# Altium schematic symbol library FPGA_Xilinx_Virtex6.SchLib: 28 symbols (part 11 of 21)
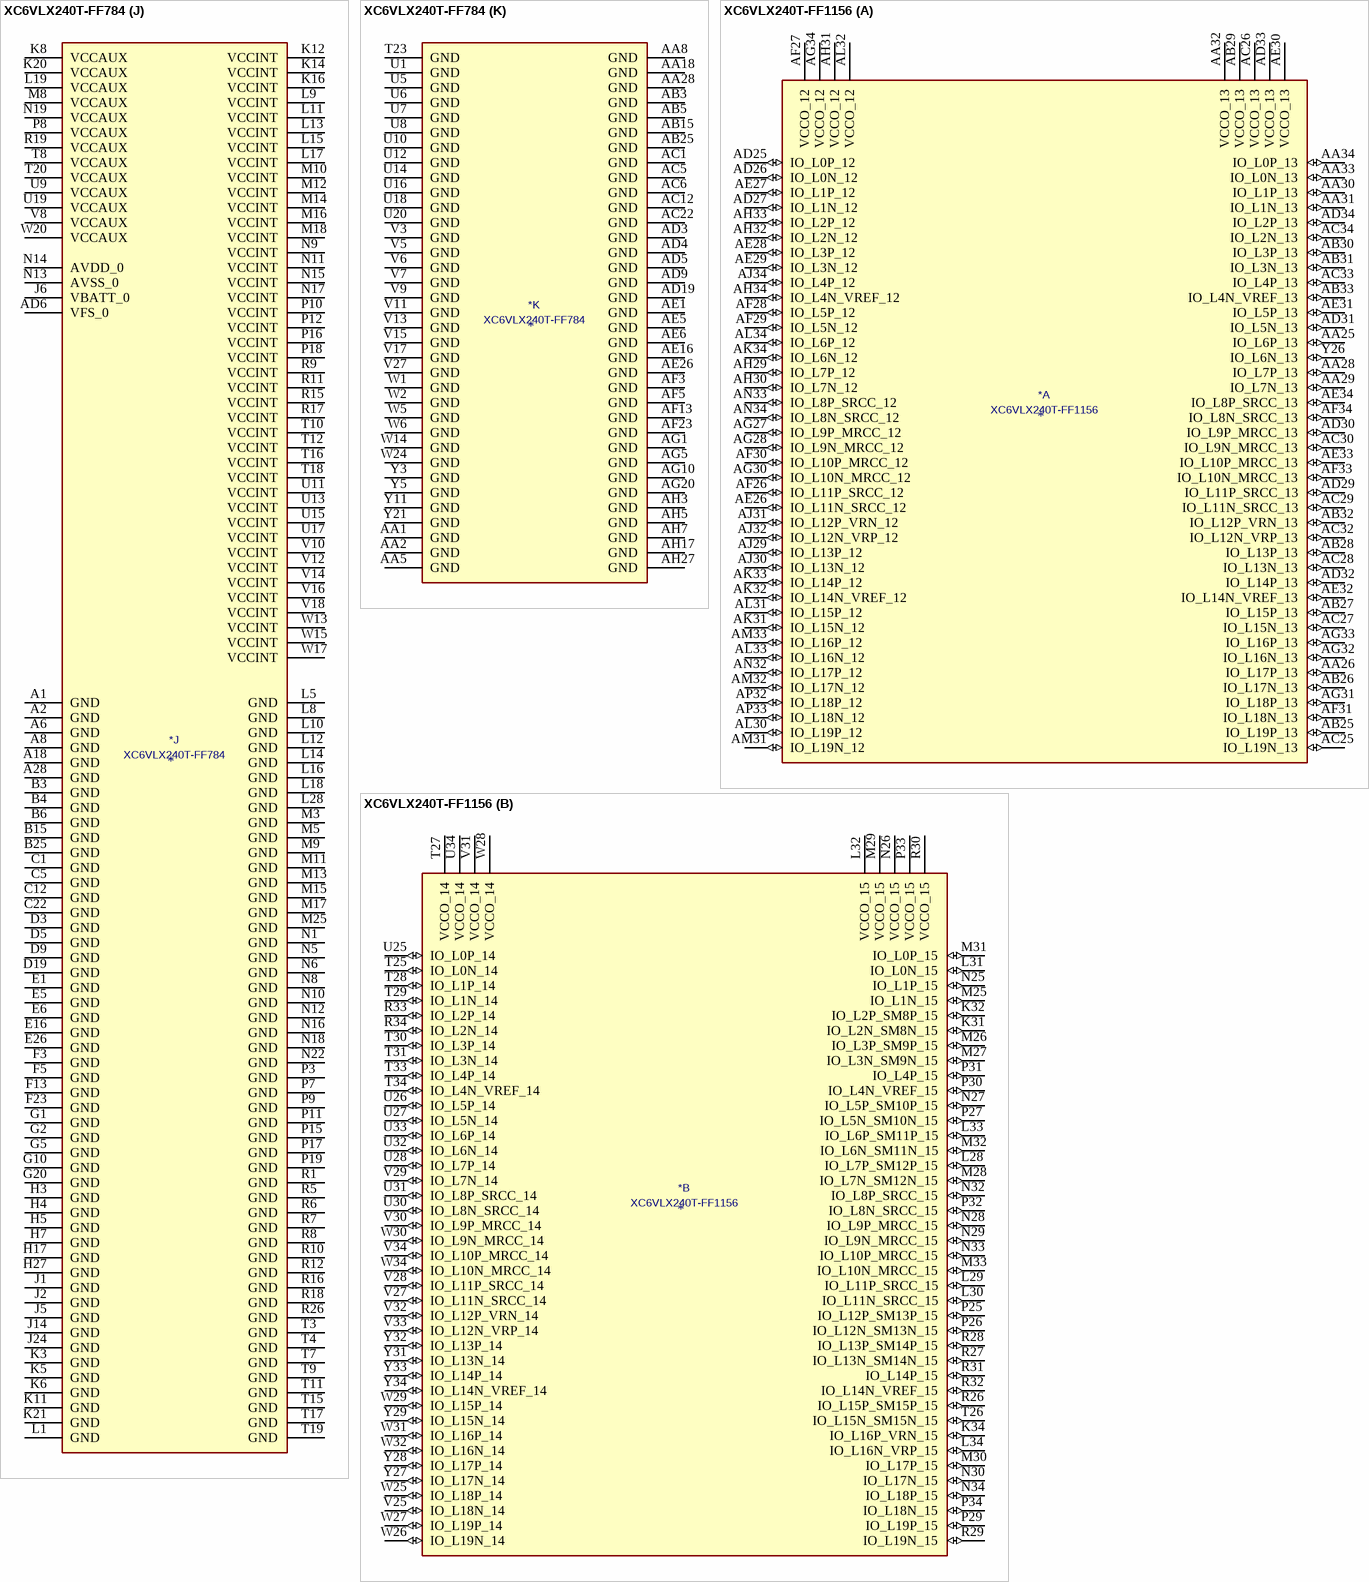
[diagram p111: symbols XC6VLX240T-FF784 to XC6VLX240T-FF1156]

## XC6VLX240T-FF784
designator *  value XC6VLX240T-FF784
ki_keywords: FPGA; ki_description: Virtex 6 LXT 240 XC6VLX240T-FF784
part A pins: H25 IO_L1P_15 (io), H26 IO_L1N_15 (io), J23 IO_L2N_SM8N_15 (io), J25 IO_L5N_SM10N_15 (io), J26 IO_L3P_SM9P_15 (io), J27 IO_L3N_SM9N_15 (io), J28 IO_L7P_SM12P_15 (io), K22 IO_L0P_15 (io), K23 IO_L0N_15 (io), K24 IO_L2P_SM8P_15 (io), K25 IO_L5P_SM10P_15 (io), K26 VCCO_15 (power), K27 IO_L9P_MRCC_15 (io), K28 IO_L7N_SM12N_15 (io), L20 IO_L4P_15 (io), L21 IO_L8P_SRCC_15 (io), L22 IO_L8N_SRCC_15 (io), L23 VCCO_15 (power), L24 IO_L14P_15 (io), L25 IO_L14N_VREF_15 (io), L26 IO_L9N_MRCC_15 (io), L27 IO_L12N_SM13N_15 (io), M19 IO_L4N_VREF_15 (io), M20 VCCO_15 (power), M21 IO_L10N_MRCC_15 (io), M22 IO_L10P_MRCC_15 (io), M23 IO_L6P_SM11P_15 (io), M24 IO_L6N_SM11N_15 (io), M26 IO_L11P_SRCC_15 (io), M27 IO_L12P_SM13P_15 (io), M28 IO_L15N_SM15N_15 (io), N20 IO_L18P_15 (io), N21 IO_L18N_15 (io), N23 IO_L19P_15 (io), N24 IO_L16P_VRN_15 (io), N25 IO_L16N_VRP_15 (io), N26 IO_L11N_SRCC_15 (io), N27 VCCO_15 (power), N28 IO_L15P_SM15P_15 (io), P20 IO_L14N_VREF_14 (io), P21 IO_L8P_SRCC_14 (io), P22 IO_L8N_SRCC_14 (io), P23 IO_L19N_15 (io), P24 VCCO_15 (power), P25 IO_L17N_15 (io), P26 IO_L17P_15 (io), P27 IO_L13N_SM14N_15 (io), P28 IO_L13P_SM14P_15 (io), R20 IO_L14P_14 (io), R21 VCCO_14 (power), R22 IO_L18P_14 (io), R23 IO_L18N_14 (io), R24 IO_L12P_VRN_14 (io), R25 IO_L12N_VRP_14 (io), R27 IO_L0P_14 (io), R28 IO_L0N_14 (io), T21 IO_L19P_14 (io), T22 IO_L19N_14 (io), T24 IO_L15P_14 (io), T25 IO_L15N_14 (io), T26 IO_L10N_MRCC_14 (io), T27 IO_L1P_14 (io), T28 VCCO_14 (power), U21 IO_L17N_14 (io), U22 IO_L17P_14 (io), U23 IO_L11N_SRCC_14 (io), U24 IO_L16N_14 (io), U25 VCCO_14 (power), U26 IO_L10P_MRCC_14 (io), U27 IO_L1N_14 (io), U28 IO_L2N_14 (io), V22 VCCO_14 (power), V23 IO_L11P_SRCC_14 (io), V24 IO_L16P_14 (io), V25 IO_L3N_14 (io), V26 IO_L4N_VREF_14 (io), V28 IO_L2P_14 (io), W22 IO_L13N_14 (io), W23 IO_L9N_MRCC_14 (io), W25 IO_L3P_14 (io), W26 IO_L4P_14 (io), W27 IO_L6P_14 (io), W28 IO_L5N_14 (io), Y22 IO_L13P_14 (io), Y23 IO_L9P_MRCC_14 (io), Y24 IO_L7N_14 (io), Y25 IO_L7P_14 (io), Y26 VCCO_14 (power), Y27 IO_L6N_14 (io), Y28 IO_L5P_14 (io)
part B pins: A26 IO_L7P_16 (io), A27 IO_L7N_16 (io), AA19 IO_L12P_VRN_23 (io), AA20 IO_L11N_SRCC_23 (io), AA21 IO_L5P_23 (io), AB18 IO_L16P_23 (io), AB19 IO_L15N_23 (io), AB20 VCCO_23 (power), AB21 IO_L5N_23 (io), AC18 IO_L16N_23 (io), AC19 IO_L15P_23 (io), AC20 IO_L9N_MRCC_23 (io), AC21 IO_L1N_23 (io), AD18 IO_L14P_23 (io), AD20 IO_L8P_SRCC_23 (io), AD21 IO_L9P_MRCC_23 (io), AD22 IO_L1P_23 (io), AE18 IO_L14N_VREF_23 (io), AE19 IO_L10N_MRCC_23 (io), AE20 IO_L8N_SRCC_23 (io), AE21 VCCO_23 (power), AE22 IO_L4N_VREF_23 (io), AF17 IO_L13N_23 (io), AF18 VCCO_23 (power), AF19 IO_L10P_MRCC_23 (io), AF20 IO_L7N_23 (io), AF21 IO_L3N_23 (io), AF22 IO_L4P_23 (io), AG17 IO_L13P_23 (io), AG18 IO_L18P_23 (io), AG19 IO_L19N_23 (io), AG21 IO_L7P_23 (io), AG22 IO_L3P_23 (io), AH18 IO_L18N_23 (io), AH19 IO_L19P_23 (io), AH20 IO_L17P_23 (io), AH21 IO_L17N_23 (io), AH22 VCCO_23 (power), B24 IO_L1P_16 (io), B26 IO_L3P_16 (io), B27 IO_L9P_MRCC_16 (io), B28 IO_L9N_MRCC_16 (io), C23 IO_L4N_VREF_16 (io), C24 IO_L1N_16 (io), C25 IO_L3N_16 (io), C26 IO_L18N_16 (io), C27 VCCO_16 (power), C28 IO_L11N_SRCC_16 (io), D22 IO_L4P_16 (io), D23 IO_L14N_VREF_16 (io), D24 VCCO_16 (power), D25 IO_L6N_16 (io), D26 IO_L18P_16 (io), D27 IO_L11P_SRCC_16 (io), D28 IO_L13P_16 (io), E22 IO_L5P_16 (io), E23 IO_L14P_16 (io), E24 IO_L6P_16 (io), E25 IO_L10P_MRCC_16 (io), E27 IO_L16N_16 (io), E28 IO_L13N_16 (io), F22 IO_L5N_16 (io), F24 IO_L10N_MRCC_16 (io), F25 IO_L15N_16 (io), F26 IO_L15P_16 (io), F27 IO_L16P_16 (io), F28 VCCO_16 (power), G22 IO_L0P_16 (io), G23 IO_L2N_16 (io), G24 IO_L12N_VRP_16 (io), G25 VCCO_16 (power), G26 IO_L17N_16 (io), G27 IO_L17P_16 (io), G28 IO_L19P_16 (io), H21 IO_L0N_16 (io), H22 VCCO_16 (power), H23 IO_L2P_16 (io), H24 IO_L12P_VRN_16 (io), H28 IO_L19N_16 (io), J21 IO_L8P_SRCC_16 (io), J22 IO_L8N_SRCC_16 (io), V19 IO_L2N_23 (io), V20 IO_L2P_23 (io), V21 IO_L0N_23 (io), W18 IO_L6N_23 (io), W19 VCCO_23 (power), W21 IO_L0P_23 (io), Y18 IO_L6P_23 (io), Y19 IO_L12N_VRP_23 (io), Y20 IO_L11P_SRCC_23 (io)
part C pins: A19 IO_L8N_SRCC_25 (io), A20 IO_L8P_SRCC_25 (io), A21 IO_L11P_SRCC_25 (io), A22 IO_L11N_SRCC_25 (io), A23 VCCO_25 (power), A24 IO_L15P_25 (io), A25 IO_L15N_25 (io), AA22 IO_L19N_24 (io), AA23 VCCO_24 (power), AA24 IO_L6P_D7_24 (io), AA25 IO_L6N_D6_24 (io), AA26 IO_L0P_GC_24 (io), AA27 IO_L0N_GC_24 (io), AB22 IO_L19P_24 (io), AB23 IO_L11P_SRCC_24 (io), AB24 IO_L16N_CSO_B_24 (io), AB26 IO_L8N_SRCC_24 (io), AB27 IO_L8P_SRCC_24 (io), AB28 IO_L2N_D14_24 (io), AC23 IO_L11N_SRCC_24 (io), AC24 IO_L16P_RS0_24 (io), AC25 IO_L7P_D5_24 (io), AC26 IO_L12P_D3_24 (io), AC27 VCCO_24 (power), AC28 IO_L2P_D15_24 (io), AD23 IO_L18N_24 (io), AD24 VCCO_24 (power), AD25 IO_L7N_D4_24 (io), AD26 IO_L12N_D2_FS2_24 (io), AD27 IO_L1N_GC_24 (io), AD28 IO_L1P_GC_24 (io), AE23 IO_L18P_24 (io), AE24 IO_L14P_FCS_B_24 (io), AE25 IO_L10P_MRCC_24 (io), AE27 IO_L5N_D8_24 (io), AE28 IO_L5P_D9_24 (io), AF24 IO_L14N_VREF_FOE_B_MOSI_24 (io), AF25 IO_L10N_MRCC_24 (io), AF26 IO_L9P_MRCC_24 (io), AF27 IO_L3N_D12_24 (io), AF28 VCCO_24 (power), AG23 IO_L17N_VRP_24 (io), AG24 IO_L15P_FWE_B_24 (io), AG25 VCCO_24 (power), AG26 IO_L9N_MRCC_24 (io), AG27 IO_L4P_D11_24 (io), AG28 IO_L3P_D13_24 (io), AH23 IO_L17P_VRN_24 (io), AH24 IO_L15N_RS1_24 (io), AH25 IO_L13N_D0_FS0_24 (io), AH26 IO_L13P_D1_FS1_24 (io), AH28 IO_L4N_VREF_D10_24 (io), B18 IO_L5P_25 (io), B19 IO_L5N_25 (io), B20 VCCO_25 (power), B21 IO_L13P_25 (io), B22 IO_L17P_25 (io), B23 IO_L17N_25 (io), C18 IO_L3P_25 (io), C19 IO_L12P_25 (io), C20 IO_L12N_25 (io), C21 IO_L13N_25 (io), D17 IO_L6P_25 (io), D18 IO_L3N_25 (io), D20 IO_L10P_MRCC_25 (io), D21 IO_L16N_VRP_25 (io), E17 IO_L6N_25 (io), E18 IO_L7P_25 (io), E19 IO_L10N_MRCC_25 (io), E20 IO_L16P_VRN_25 (io), E21 VCCO_25 (power), F17 IO_L1N_25 (io), F18 VCCO_25 (power), F19 IO_L7N_25 (io), F20 IO_L19P_GC_25 (io), F21 IO_L19N_GC_25 (io), G17 IO_L1P_25 (io), G18 IO_L4P_25 (io), G19 IO_L9N_MRCC_25 (io), G21 IO_L18N_GC_25 (io), H18 IO_L4N_VREF_25 (io), H19 IO_L9P_MRCC_25 (io), H20 IO_L18P_GC_25 (io), J17 IO_L2P_25 (io), J18 IO_L2N_25 (io), J19 VCCO_25 (power), J20 IO_L14N_VREF_25 (io), K17 IO_L0P_25 (io), K18 IO_L0N_25 (io), K19 IO_L14P_25 (io)
part D pins: A11 IO_L14P_26 (io), A12 IO_L14N_VREF_26 (io), A13 VCCO_26 (power), A14 IO_L9N_MRCC_26 (io), A15 IO_L13P_26 (io), A16 IO_L13N_26 (io), A17 IO_L17P_26 (io), AA12 IO_L8N_SRCC_34 (io), AA13 VCCO_34 (power), AA14 IO_L3N_A12_D28_34 (io), AA15 IO_L16P_A21_34 (io), AA16 IO_L17P_A19_34 (io), AA17 IO_L19N_VRP_34 (io), AB12 IO_L1P_GC_34 (io), AB13 IO_L3P_A13_D29_34 (io), AB14 IO_L5P_A09_D25_34 (io), AB16 IO_L14P_A25_34 (io), AB17 IO_L17N_A18_34 (io), AC13 IO_L1N_GC_34 (io), AC14 IO_L5N_A08_D24_34 (io), AC15 IO_L11N_SRCC_34 (io), AC16 IO_L14N_VREF_A24_34 (io), AC17 VCCO_34 (power), AD12 IO_L0N_GC_34 (io), AD13 IO_L6P_A07_D23_34 (io), AD14 VCCO_34 (power), AD15 IO_L11P_SRCC_34 (io), AD16 IO_L15P_A23_34 (io), AD17 IO_L12N_A02_D18_34 (io), AE13 IO_L0P_GC_34 (io), AE14 IO_L6N_A06_D22_34 (io), AE15 IO_L15N_A22_34 (io), AE17 IO_L12P_A03_D19_34 (io), AF14 IO_L4P_A11_D27_34 (io), AF15 IO_L10N_MRCC_34 (io), AF16 IO_L13P_A01_D17_34 (io), AG13 IO_L4N_VREF_A10_D26_34 (io), AG14 IO_L10P_MRCC_34 (io), AG15 VCCO_34 (power), AG16 IO_L13N_A00_D16_34 (io), AH13 IO_L7P_A05_D21_34 (io), AH14 IO_L7N_A04_D20_34 (io), AH15 IO_L9P_MRCC_34 (io), AH16 IO_L9N_MRCC_34 (io), B11 IO_L5P_26 (io), B12 IO_L18P_26 (io), B13 IO_L7N_26 (io), B14 IO_L9P_MRCC_26 (io), B16 IO_L15N_26 (io), B17 IO_L17N_26 (io), C11 IO_L5N_26 (io), C13 IO_L18N_26 (io), C14 IO_L7P_26 (io), C15 IO_L15P_26 (io), C16 IO_L16N_26 (io), C17 VCCO_26 (power), D11 IO_L0N_26 (io), D12 IO_L6N_26 (io), D13 IO_L6P_26 (io), D14 VCCO_26 (power), D15 IO_L12N_VRP_26 (io), D16 IO_L16P_26 (io), E11 VCCO_26 (power), E12 IO_L0P_26 (io), E13 IO_L1P_26 (io), E14 IO_L1N_26 (io), E15 IO_L12P_VRN_26 (io), F12 IO_L11N_SRCC_26 (io), F14 IO_L3N_26 (io), F15 IO_L10N_MRCC_26 (io), F16 IO_L10P_MRCC_26 (io), G12 IO_L11P_SRCC_26 (io), G13 IO_L19N_26 (io), G14 IO_L3P_26 (io), G15 VCCO_26 (power), G16 IO_L2N_26 (io), H14 IO_L19P_26 (io), H15 IO_L4N_VREF_26 (io), H16 IO_L2P_26 (io), J15 IO_L8P_SRCC_26 (io), J16 IO_L4P_26 (io), K15 IO_L8N_SRCC_26 (io), W12 IO_L2P_A15_D31_34 (io), W16 IO_L18P_A17_34 (io), Y12 IO_L2N_A14_D30_34 (io), Y13 IO_L8P_SRCC_34 (io), Y14 IO_L16N_A20_34 (io), Y15 IO_L18N_A16_34 (io), Y16 VCCO_34 (power), Y17 IO_L19P_VRN_34 (io)
part E pins: A7 IO_L3P_36 (io), A9 IO_L2N_36 (io), A10 IO_L2P_36 (io), AA7 IO_L2P_SM0P_35 (io), AA9 IO_L4P_35 (io), AA10 IO_L1N_35 (io), AA11 IO_L9N_MRCC_35 (io), AB7 IO_L2N_SM0N_35 (io), AB8 IO_L6N_SM3N_35 (io), AB9 IO_L4N_VREF_35 (io), AB10 VCCO_35 (power), AB11 IO_L9P_MRCC_35 (io), AC7 VCCO_35 (power), AC8 IO_L6P_SM3P_35 (io), AC9 IO_L3P_SM1P_35 (io), AC10 IO_L5P_SM2P_35 (io), AC11 IO_L7N_SM4N_35 (io), AD7 IO_L10P_MRCC_35 (io), AD8 IO_L3N_SM1N_35 (io), AD10 IO_L5N_SM2N_35 (io), AD11 IO_L7P_SM4P_35 (io), AE7 IO_L10N_MRCC_35 (io), AE8 IO_L12N_SM5N_35 (io), AE9 IO_L14P_35 (io), AE10 IO_L18N_GC_35 (io), AE11 VCCO_35 (power), AE12 IO_L15N_SM7N_35 (io), AF7 IO_L12P_SM5P_35 (io), AF8 VCCO_35 (power), AF9 IO_L14N_VREF_35 (io), AF10 IO_L18P_GC_35 (io), AF11 IO_L11P_SRCC_35 (io), AF12 IO_L15P_SM7P_35 (io), AG7 IO_L16P_VRN_35 (io), AG8 IO_L16N_VRP_35 (io), AG9 IO_L13P_SM6P_35 (io), AG11 IO_L11N_SRCC_35 (io), AG12 IO_L19N_GC_35 (io), AH8 IO_L13N_SM6N_35 (io), AH9 IO_L17P_35 (io), AH10 IO_L17N_35 (io), AH11 IO_L19P_GC_35 (io), AH12 VCCO_35 (power), B7 IO_L3N_36 (io), B8 IO_L1P_36 (io), B9 IO_L12P_VRN_36 (io), B10 VCCO_36 (power), C7 VCCO_36 (power), C8 IO_L1N_36 (io), C9 IO_L12N_VRP_36 (io), C10 IO_L8N_SRCC_36 (io), D7 IO_L14P_36 (io), D8 IO_L5P_36 (io), D10 IO_L8P_SRCC_36 (io), E7 IO_L14N_VREF_36 (io), E8 IO_L7P_36 (io), E9 IO_L5N_36 (io), E10 IO_L0N_36 (io), F7 IO_L9P_MRCC_36 (io), F8 VCCO_36 (power), F9 IO_L7N_36 (io), F10 IO_L6N_36 (io), F11 IO_L0P_36 (io), G7 IO_L9N_MRCC_36 (io), G8 IO_L13P_36 (io), G9 IO_L13N_36 (io), G11 IO_L6P_36 (io), H8 IO_L15P_36 (io), H9 IO_L15N_36 (io), H10 IO_L10N_MRCC_36 (io), H11 IO_L10P_MRCC_36 (io), H12 VCCO_36 (power), H13 IO_L4P_36 (io), J7 IO_L17P_36 (io), J8 IO_L17N_36 (io), J9 VCCO_36 (power), J10 IO_L16N_36 (io), J11 IO_L16P_36 (io), J12 IO_L11P_SRCC_36 (io), J13 IO_L4N_VREF_36 (io), K7 IO_L19P_36 (io), K9 IO_L18P_36 (io), K10 IO_L18N_36 (io), K13 IO_L11N_SRCC_36 (io), L7 IO_L19N_36 (io), W8 IO_L0P_35 (io), W9 VCCO_35 (power), W10 IO_L8N_SRCC_35 (io), W11 IO_L8P_SRCC_35 (io), Y9 IO_L0N_35 (io), Y10 IO_L1P_35 (io)
part F pins: AA3 MGTREFCLK0N_114 (io), AA4 MGTREFCLK0P_114 (io), AB1 MGTTXP2_114 (io), AB2 MGTTXN2_114 (io), AC3 MGTRXP3_114 (io), AC4 MGTRXN3_114 (io), AD1 MGTTXP1_114 (io), AD2 MGTTXN1_114 (io), AE3 MGTRXP2_114 (io), AE4 MGTRXN2_114 (io), AF1 MGTTXP0_114 (io), AF2 MGTTXN0_114 (io), AG3 MGTRXP1_114 (io), AG4 MGTRXN1_114 (io), AH1 MGTRXP0_114 (io), AH2 MGTRXN0_114 (io), L3 MGTRXP3_115 (io), L4 MGTRXN3_115 (io), M1 MGTTXP3_115 (io), M2 MGTTXN3_115 (io), N3 MGTRXP2_115 (io), N4 MGTRXN2_115 (io), P1 MGTTXP2_115 (io), P2 MGTTXN2_115 (io), P5 MGTREFCLK1N_115 (io), P6 MGTREFCLK1P_115 (io), R3 MGTRXP1_115 (io), R4 MGTRXN1_115 (io), T1 MGTTXP1_115 (io), T2 MGTTXN1_115 (io), T5 MGTREFCLK0N_115 (io), T6 MGTREFCLK0P_115 (io), U3 MGTRXP0_115 (io), U4 MGTRXN0_115 (io), V1 MGTTXP0_115 (io), V2 MGTTXN0_115 (io), W3 MGTREFCLK1N_114 (io), W4 MGTREFCLK1P_114 (io), Y1 MGTTXP3_114 (io), Y2 MGTTXN3_114 (io)
part G pins: A3 MGTRXP3_116 (io), A4 MGTRXN3_116 (io), B1 MGTRXP2_116 (io), B2 MGTRXN2_116 (io), C3 MGTRXP1_116 (io), C4 MGTRXN1_116 (io), D1 MGTTXP3_116 (io), D2 MGTTXN3_116 (io), E3 MGTRXP0_116 (io), E4 MGTRXN0_116 (io), F1 MGTTXP2_116 (io), F2 MGTTXN2_116 (io), G3 MGTREFCLK1N_116 (io), G4 MGTREFCLK1P_116 (io), H1 MGTTXP1_116 (io), H2 MGTTXN1_116 (io), J3 MGTREFCLK0N_116 (io), J4 MGTREFCLK0P_116 (io), K1 MGTTXP0_116 (io), K2 MGTTXN0_116 (io)
part H pins: A5 MGTAVTTRCAL_115 (power), AB4 MGTAVCC (power), AC2 MGTAVTT (power), AE2 MGTAVTT (power), AF4 MGTAVCC (power), AG2 MGTAVTT (power), AH4 MGTAVCC (power), B5 MGTRREF_115 (power), C2 MGTAVTT (power), D4 MGTAVCC (power), E2 MGTAVTT (power), F4 MGTAVCC (power), K4 MGTAVCC (power), L2 MGTAVTT (power), M4 MGTAVCC (power), N2 MGTAVTT (power), P4 MGTAVCC (power), R2 MGTAVTT (power), U2 MGTAVTT (power), V4 MGTAVCC (power), Y4 MGTAVCC (power)
part I pins: AA6 TDI_0 (io), AB6 TCK_0 (io), AF6 DOUT_BUSY_0 (io), AG6 CSI_B_0 (io), AH6 CCLK_0 (io), C6 M2_0 (io), D6 M1_0 (io), F6 M0_0 (io), G6 RDWR_B_0 (io), H6 DIN_0 (io), L6 DONE_0 (io), M6 INIT_B_0 (io), M7 PROGRAM_B_0 (io), N7 HSWAPEN_0 (io), P13 VREFN_0 (io), P14 VP_0 (io), R13 VN_0 (io), R14 VREFP_0 (io), T13 DXN_0 (io), T14 DXP_0 (io), W7 VCCO_0 (power), Y6 TMS_0 (io), Y7 TDO_0 (io), Y8 VCCO_0 (power)
part J pins: A1 GND (power), A2 GND (power), A6 GND (power), A8 GND (power), A18 GND (power), A28 GND (power), AD6 VFS_0 (power), B3 GND (power), B4 GND (power), B6 GND (power), B15 GND (power), B25 GND (power), C1 GND (power), C5 GND (power), C12 GND (power), C22 GND (power), D3 GND (power), D5 GND (power), D9 GND (power), D19 GND (power), E1 GND (power), E5 GND (power), E6 GND (power), E16 GND (power), E26 GND (power), F3 GND (power), F5 GND (power), F13 GND (power), F23 GND (power), G1 GND (power), G2 GND (power), G5 GND (power), G10 GND (power), G20 GND (power), H3 GND (power), H4 GND (power), H5 GND (power), H7 GND (power), H17 GND (power), H27 GND (power), J1 GND (power), J2 GND (power), J5 GND (power), J6 VBATT_0 (power), J14 GND (power), J24 GND (power), K3 GND (power), K5 GND (power), K6 GND (power), K8 VCCAUX (power), K11 GND (power), K12 VCCINT (power), K14 VCCINT (power), K16 VCCINT (power), K20 VCCAUX (power), K21 GND (power), L1 GND (power), L5 GND (power), L8 GND (power), L9 VCCINT (power), L10 GND (power), L11 VCCINT (power), L12 GND (power), L13 VCCINT (power), L14 GND (power), L15 VCCINT (power), L16 GND (power), L17 VCCINT (power), L18 GND (power), L19 VCCAUX (power), L28 GND (power), M3 GND (power), M5 GND (power), M8 VCCAUX (power), M9 GND (power), M10 VCCINT (power), M11 GND (power), M12 VCCINT (power), M13 GND (power), M14 VCCINT (power), M15 GND (power), M16 VCCINT (power), M17 GND (power), M18 VCCINT (power), M25 GND (power), N1 GND (power), N5 GND (power), N6 GND (power), N8 GND (power), N9 VCCINT (power), N10 GND (power), N11 VCCINT (power), N12 GND (power), N13 AVSS_0 (power), N14 AVDD_0 (power), N15 VCCINT (power), N16 GND (power), N17 VCCINT (power), N18 GND (power), N19 VCCAUX (power), N22 GND (power), P3 GND (power), P7 GND (power), P8 VCCAUX (power), P9 GND (power), P10 VCCINT (power), P11 GND (power), P12 VCCINT (power), P15 GND (power), P16 VCCINT (power), P17 GND (power), P18 VCCINT (power), P19 GND (power), R1 GND (power), R5 GND (power), R6 GND (power), R7 GND (power), R8 GND (power), R9 VCCINT (power), R10 GND (power), R11 VCCINT (power), R12 GND (power), R15 VCCINT (power), R16 GND (power), R17 VCCINT (power), R18 GND (power), R19 VCCAUX (power), R26 GND (power), T3 GND (power), T4 GND (power), T7 GND (power), T8 VCCAUX (power), T9 GND (power), T10 VCCINT (power), T11 GND (power), T12 VCCINT (power), T15 GND (power), T16 VCCINT (power), T17 GND (power), T18 VCCINT (power), T19 GND (power), T20 VCCAUX (power), U9 VCCAUX (power), U11 VCCINT (power), U13 VCCINT (power), U15 VCCINT (power), U17 VCCINT (power), U19 VCCAUX (power), V8 VCCAUX (power), V10 VCCINT (power), V12 VCCINT (power), V14 VCCINT (power), V16 VCCINT (power), V18 VCCINT (power), W13 VCCINT (power), W15 VCCINT (power), W17 VCCINT (power), W20 VCCAUX (power)
part K pins: AA1 GND (power), AA2 GND (power), AA5 GND (power), AA8 GND (power), AA18 GND (power), AA28 GND (power), AB3 GND (power), AB5 GND (power), AB15 GND (power), AB25 GND (power), AC1 GND (power), AC5 GND (power), AC6 GND (power), AC12 GND (power), AC22 GND (power), AD3 GND (power), AD4 GND (power), AD5 GND (power), AD9 GND (power), AD19 GND (power), AE1 GND (power), AE5 GND (power), AE6 GND (power), AE16 GND (power), AE26 GND (power), AF3 GND (power), AF5 GND (power), AF13 GND (power), AF23 GND (power), AG1 GND (power), AG5 GND (power), AG10 GND (power), AG20 GND (power), AH3 GND (power), AH5 GND (power), AH7 GND (power), AH17 GND (power), AH27 GND (power), T23 GND (power), U1 GND (power), U5 GND (power), U6 GND (power), U7 GND (power), U8 GND (power), U10 GND (power), U12 GND (power), U14 GND (power), U16 GND (power), U18 GND (power), U20 GND (power), V3 GND (power), V5 GND (power), V6 GND (power), V7 GND (power), V9 GND (power), V11 GND (power), V13 GND (power), V15 GND (power), V17 GND (power), V27 GND (power), W1 GND (power), W2 GND (power), W5 GND (power), W6 GND (power), W14 GND (power), W24 GND (power), Y3 GND (power), Y5 GND (power), Y11 GND (power), Y21 GND (power)

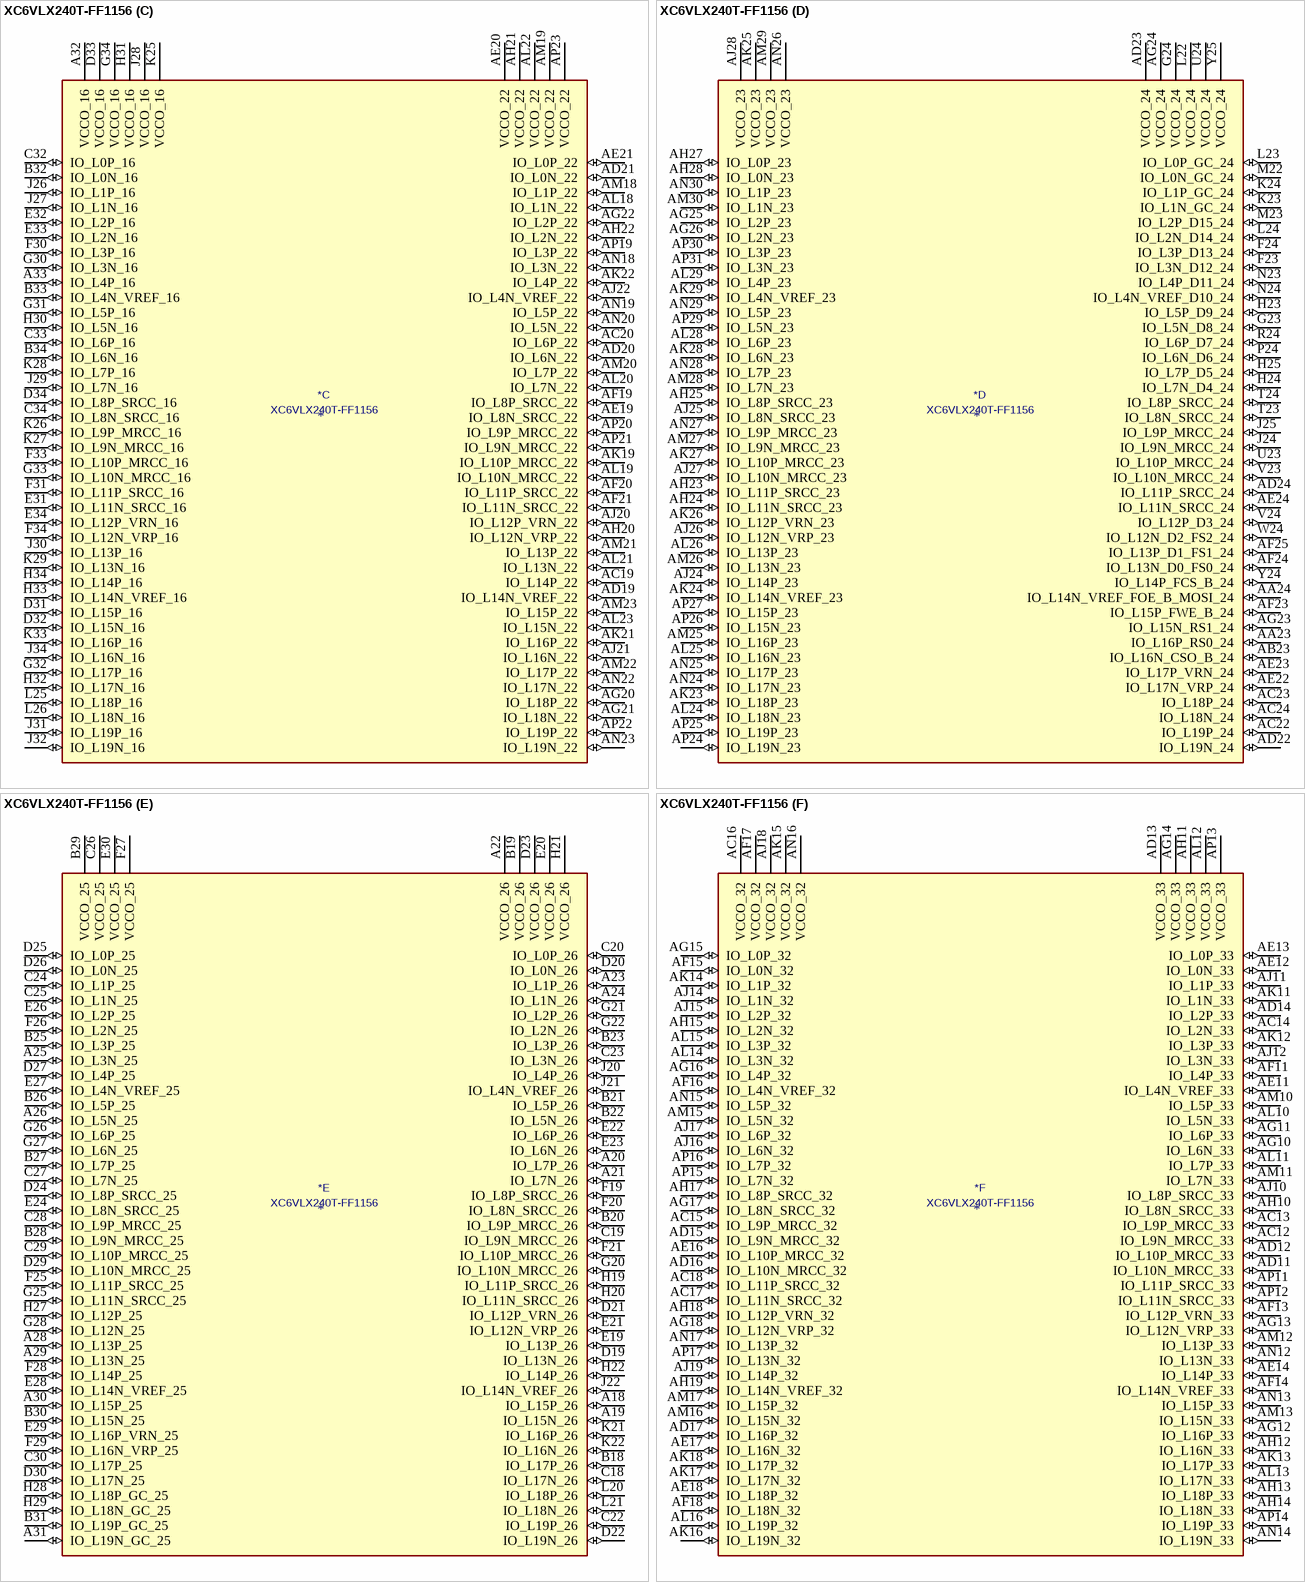
[diagram p56: symbol XC6VLX240T-FF1156]

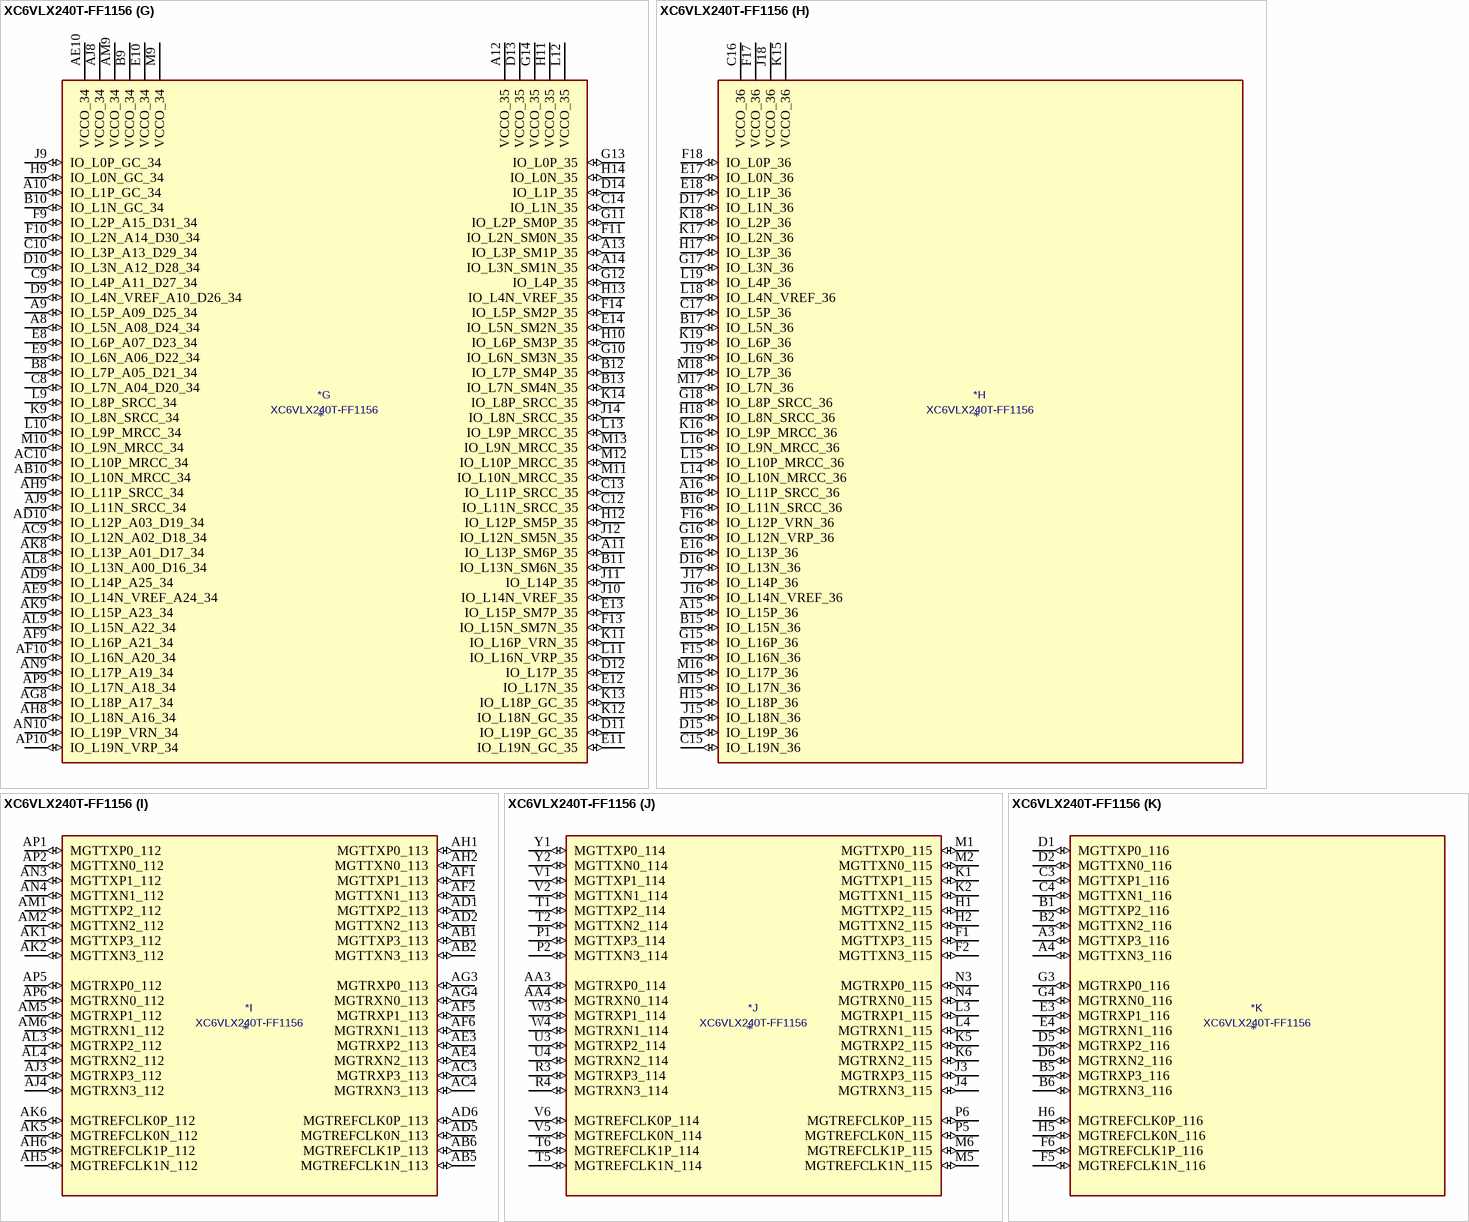
[diagram p57: symbol XC6VLX240T-FF1156]

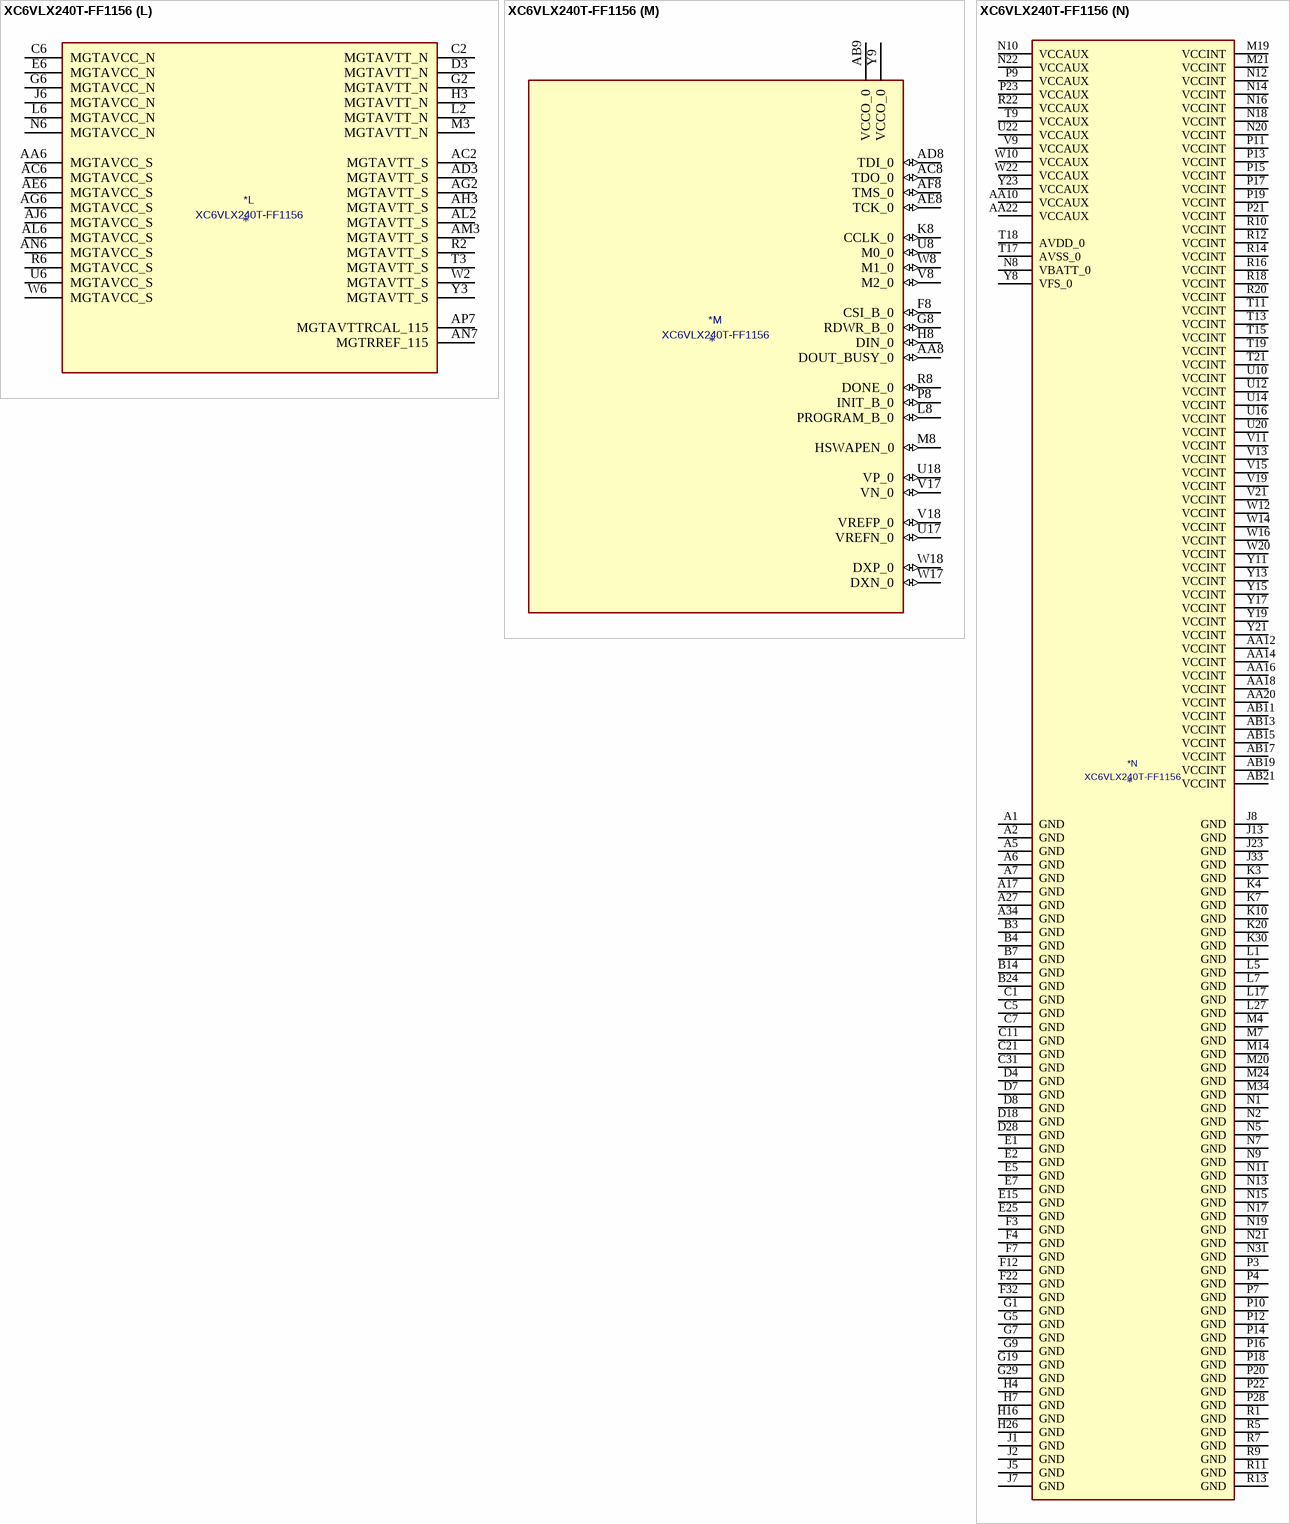
[diagram p58: symbol XC6VLX240T-FF1156]

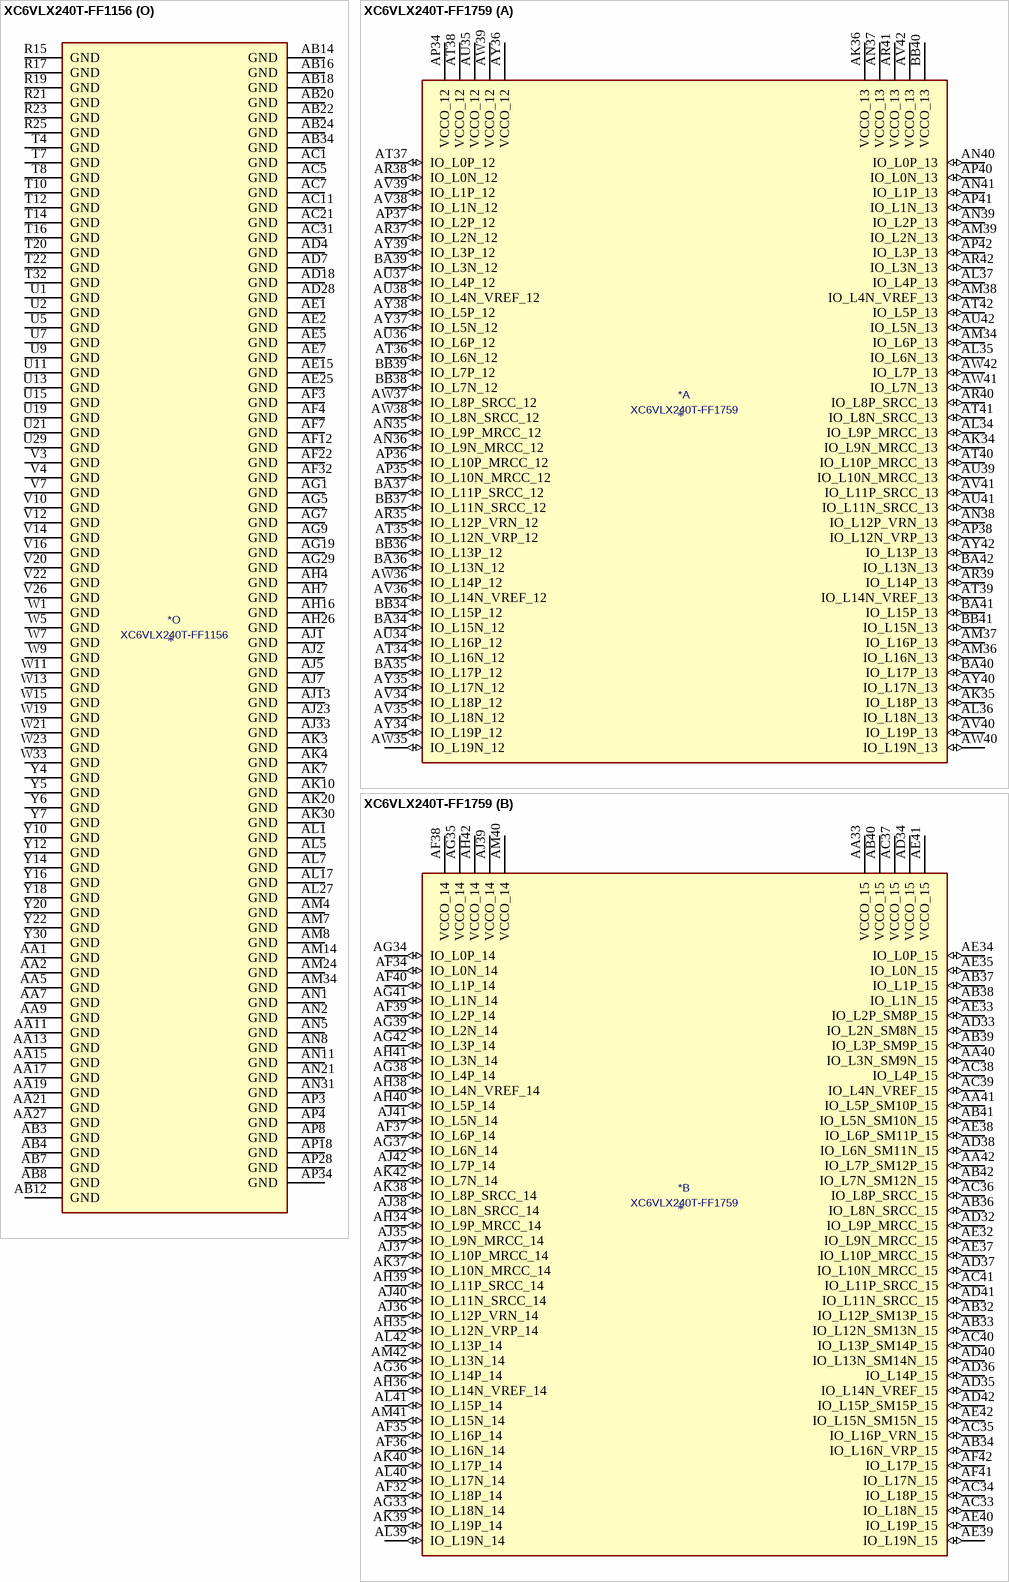
[diagram p59: symbols XC6VLX240T-FF1156 to XC6VLX240T-FF1759]

## XC6VLX240T-FF1156
designator *  value XC6VLX240T-FF1156
ki_keywords: FPGA; ki_description: Virtex 6 LXT 240 XC6VLX240T-FF1156
part A pins: AA25 IO_L6P_13 (io), AA26 IO_L17P_13 (io), AA28 IO_L7P_13 (io), AA29 IO_L7N_13 (io), AA30 IO_L1P_13 (io), AA31 IO_L1N_13 (io), AA32 VCCO_13 (power), AA33 IO_L0N_13 (io), AA34 IO_L0P_13 (io), AB25 IO_L19P_13 (io), AB26 IO_L17N_13 (io), AB27 IO_L15P_13 (io), AB28 IO_L13P_13 (io), AB29 VCCO_13 (power), AB30 IO_L3P_13 (io), AB31 IO_L3N_13 (io), AB32 IO_L12P_VRN_13 (io), AB33 IO_L4N_VREF_13 (io), AC25 IO_L19N_13 (io), AC26 VCCO_13 (power), AC27 IO_L15N_13 (io), AC28 IO_L13N_13 (io), AC29 IO_L11N_SRCC_13 (io), AC30 IO_L9N_MRCC_13 (io), AC32 IO_L12N_VRP_13 (io), AC33 IO_L4P_13 (io), AC34 IO_L2N_13 (io), AD25 IO_L0P_12 (io), AD26 IO_L0N_12 (io), AD27 IO_L1N_12 (io), AD29 IO_L11P_SRCC_13 (io), AD30 IO_L9P_MRCC_13 (io), AD31 IO_L5N_13 (io), AD32 IO_L14P_13 (io), AD33 VCCO_13 (power), AD34 IO_L2P_13 (io), AE26 IO_L11N_SRCC_12 (io), AE27 IO_L1P_12 (io), AE28 IO_L3P_12 (io), AE29 IO_L3N_12 (io), AE30 VCCO_13 (power), AE31 IO_L5P_13 (io), AE32 IO_L14N_VREF_13 (io), AE33 IO_L10P_MRCC_13 (io), AE34 IO_L8P_SRCC_13 (io), AF26 IO_L11P_SRCC_12 (io), AF27 VCCO_12 (power), AF28 IO_L5P_12 (io), AF29 IO_L5N_12 (io), AF30 IO_L10P_MRCC_12 (io), AF31 IO_L18N_13 (io), AF33 IO_L10N_MRCC_13 (io), AF34 IO_L8N_SRCC_13 (io), AG27 IO_L9P_MRCC_12 (io), AG28 IO_L9N_MRCC_12 (io), AG30 IO_L10N_MRCC_12 (io), AG31 IO_L18P_13 (io), AG32 IO_L16N_13 (io), AG33 IO_L16P_13 (io), AG34 VCCO_12 (power), AH29 IO_L7P_12 (io), AH30 IO_L7N_12 (io), AH31 VCCO_12 (power), AH32 IO_L2N_12 (io), AH33 IO_L2P_12 (io), AH34 IO_L4N_VREF_12 (io), AJ29 IO_L13P_12 (io), AJ30 IO_L13N_12 (io), AJ31 IO_L12P_VRN_12 (io), AJ32 IO_L12N_VRP_12 (io), AJ34 IO_L4P_12 (io), AK31 IO_L15N_12 (io), AK32 IO_L14N_VREF_12 (io), AK33 IO_L14P_12 (io), AK34 IO_L6N_12 (io), AL30 IO_L19P_12 (io), AL31 IO_L15P_12 (io), AL32 VCCO_12 (power), AL33 IO_L16N_12 (io), AL34 IO_L6P_12 (io), AM31 IO_L19N_12 (io), AM32 IO_L17N_12 (io), AM33 IO_L16P_12 (io), AN32 IO_L17P_12 (io), AN33 IO_L8P_SRCC_12 (io), AN34 IO_L8N_SRCC_12 (io), AP32 IO_L18P_12 (io), AP33 IO_L18N_12 (io), Y26 IO_L6N_13 (io)
part B pins: K31 IO_L2N_SM8N_15 (io), K32 IO_L2P_SM8P_15 (io), K34 IO_L16P_VRN_15 (io), L28 IO_L7P_SM12P_15 (io), L29 IO_L11P_SRCC_15 (io), L30 IO_L11N_SRCC_15 (io), L31 IO_L0N_15 (io), L32 VCCO_15 (power), L33 IO_L6P_SM11P_15 (io), L34 IO_L16N_VRP_15 (io), M25 IO_L1N_15 (io), M26 IO_L3P_SM9P_15 (io), M27 IO_L3N_SM9N_15 (io), M28 IO_L7N_SM12N_15 (io), M29 VCCO_15 (power), M30 IO_L17P_15 (io), M31 IO_L0P_15 (io), M32 IO_L6N_SM11N_15 (io), M33 IO_L10N_MRCC_15 (io), N25 IO_L1P_15 (io), N26 VCCO_15 (power), N27 IO_L5P_SM10P_15 (io), N28 IO_L9P_MRCC_15 (io), N29 IO_L9N_MRCC_15 (io), N30 IO_L17N_15 (io), N32 IO_L8P_SRCC_15 (io), N33 IO_L10P_MRCC_15 (io), N34 IO_L18P_15 (io), P25 IO_L12P_SM13P_15 (io), P26 IO_L12N_SM13N_15 (io), P27 IO_L5N_SM10N_15 (io), P29 IO_L19P_15 (io), P30 IO_L4N_VREF_15 (io), P31 IO_L4P_15 (io), P32 IO_L8N_SRCC_15 (io), P33 VCCO_15 (power), P34 IO_L18N_15 (io), R26 IO_L15P_SM15P_15 (io), R27 IO_L13N_SM14N_15 (io), R28 IO_L13P_SM14P_15 (io), R29 IO_L19N_15 (io), R30 VCCO_15 (power), R31 IO_L14P_15 (io), R32 IO_L14N_VREF_15 (io), R33 IO_L2P_14 (io), R34 IO_L2N_14 (io), T25 IO_L0N_14 (io), T26 IO_L15N_SM15N_15 (io), T27 VCCO_14 (power), T28 IO_L1P_14 (io), T29 IO_L1N_14 (io), T30 IO_L3P_14 (io), T31 IO_L3N_14 (io), T33 IO_L4P_14 (io), T34 IO_L4N_VREF_14 (io), U25 IO_L0P_14 (io), U26 IO_L5P_14 (io), U27 IO_L5N_14 (io), U28 IO_L7P_14 (io), U30 IO_L8N_SRCC_14 (io), U31 IO_L8P_SRCC_14 (io), U32 IO_L6N_14 (io), U33 IO_L6P_14 (io), U34 VCCO_14 (power), V25 IO_L18N_14 (io), V27 IO_L11N_SRCC_14 (io), V28 IO_L11P_SRCC_14 (io), V29 IO_L7N_14 (io), V30 IO_L9P_MRCC_14 (io), V31 VCCO_14 (power), V32 IO_L12P_VRN_14 (io), V33 IO_L12N_VRP_14 (io), V34 IO_L10P_MRCC_14 (io), W25 IO_L18P_14 (io), W26 IO_L19N_14 (io), W27 IO_L19P_14 (io), W28 VCCO_14 (power), W29 IO_L15P_14 (io), W30 IO_L9N_MRCC_14 (io), W31 IO_L16P_14 (io), W32 IO_L16N_14 (io), W34 IO_L10N_MRCC_14 (io), Y27 IO_L17N_14 (io), Y28 IO_L17P_14 (io), Y29 IO_L15N_14 (io), Y31 IO_L13N_14 (io), Y32 IO_L13P_14 (io), Y33 IO_L14P_14 (io), Y34 IO_L14N_VREF_14 (io)